# Altium footprint library PcbLib1.PcbLib: 12 footprints
Each footprint in its own frame and in the unit in brackets; x right, y up, seen from the top. Pads: shape width x height; smd on the part's side, far side on the other; paste and mask are expansions set on the pad; w line width, h text height; cw(c..) or ccw(c..) is an arc to the next point about the centre after c.
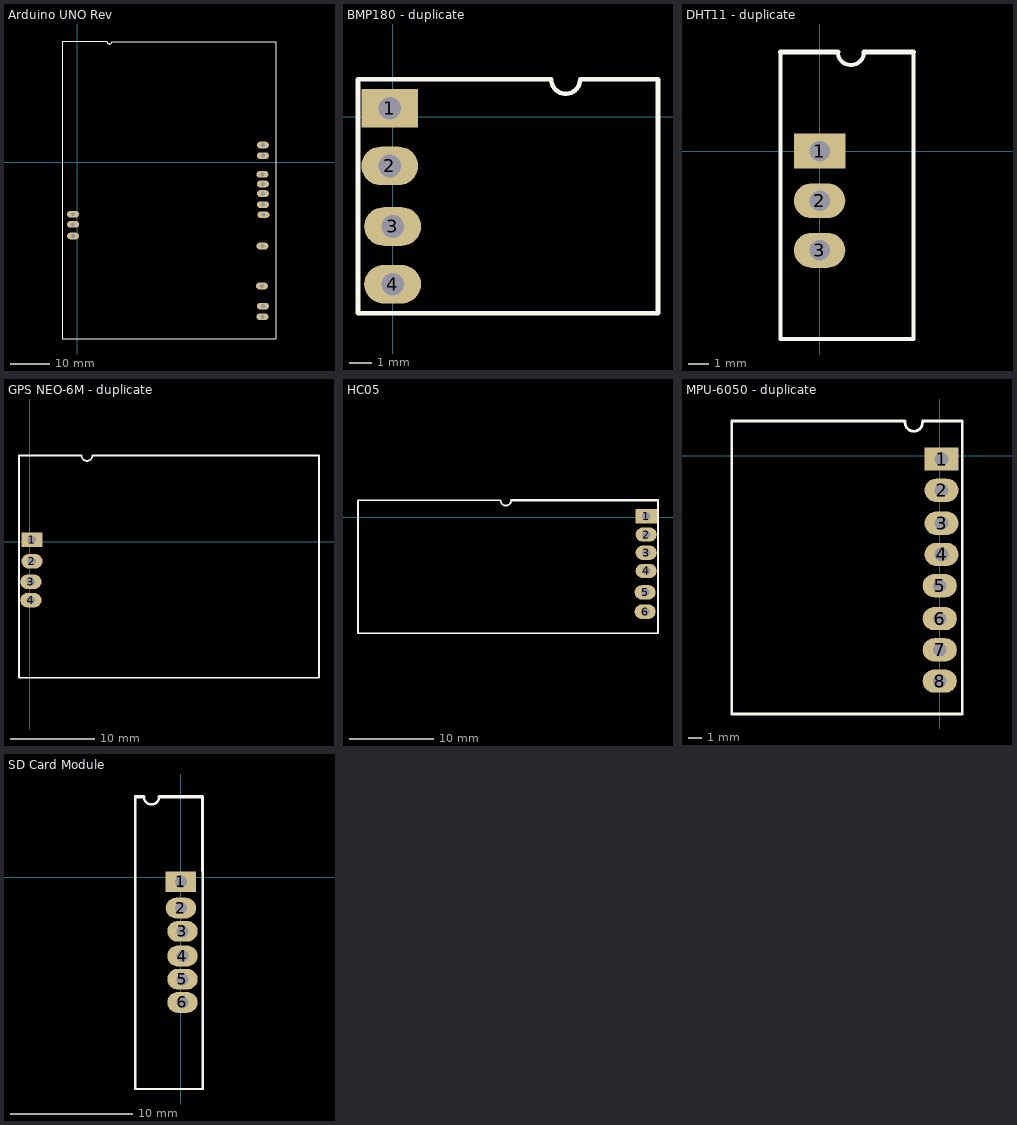
[diagram p0: the footprints below, top view; thin cyan lines are the x and y axes]

## Arduino UNO Rev [mm]
pads (14):
  oval 3x1.7 hole 1: 5(-1.016,-13.081) 6(-1.016,-15.621) 7(-1.016,-18.542) 15(46.609,-38.862) 16(46.736,-36.195) 18(46.482,-31.115) 22(46.609,-21.082) 25(46.863,-13.208) 26(46.736,-10.668) 27(46.736,-7.874) 28(46.736,-5.461) 29(46.609,-3.048) 31(46.736,1.651) 32(46.736,4.318)
Top Overlay:
  lines w0.2: -3.683,-44.45 -3.683,30.431 7.415,30.431 7.493,30.353 ccw(c8.128,30.353) 8.763,30.353 49.911,30.353 49.911,-44.45 16.383,-44.45 -3.683,-44.45
3D body "Arduino_Uno.STEP": height 0.92, standoff -14.68, extent -3.089,-44.298 49.911,30.202

## BMP180 [mm]

## BMP180 - duplicate [mm]
pads (4):
  rect 2.5x1.7 hole 1: 1(-0.127,0.381)
  oval 2.5x1.7 hole 1: 2(-0.127,-2.159) 3(0,-4.826) 4(0,-7.366)
Top Overlay:
  lines w0.2: -1.524,-8.636 -1.524,1.651 6.985,1.651 ccw(c7.62,1.651) 8.255,1.651 11.684,1.651 11.684,-8.636 -1.524,-8.636
3D body "AZDelivery GY-68 BMP-180 v4.step": height 8.61, standoff -2.94, extent -1.397,-8.539 11.593,1.681

## DHT11 [mm]

## DHT11 - duplicate [mm]
pads (3):
  rect 2.5x1.7 hole 1: 1(0,0)
  oval 2.5x1.7 hole 1: 2(0,-2.413) 3(0,-4.826)
Top Overlay:
  lines w0.2: -1.905,4.826 -1.905,-9.144 4.572,-9.144 4.572,4.826 ; 0.889,4.826 ccw(c1.524,4.826) 2.159,4.826
  lines w0.254: -1.905,4.826 0.889,4.826 ; 2.159,4.826 4.572,4.826
3D body "DHT11 module.STEP": height 3.36, standoff -31.69, extent -1.905,-9.174 4.595,4.826

## GPS NEO-6M [mm]

## GPS NEO-6M - duplicate [mm]
pads (4):
  rect 2.5x1.7 hole 1: 1(0.254,0.254)
  oval 2.5x1.7 hole 1: 2(0.254,-2.286) 3(0.127,-4.699) 4(0.127,-6.858)
Top Overlay:
  lines w0.2: -1.27,10.16 -1.27,-16.002 34.036,-16.002 34.036,10.16 7.366,10.16 cw(c6.731,10.16) 6.096,10.16
  lines w0.254: -1.27,10.16 6.096,10.16
3D body "NEO-6M.STEP": height 0.01, standoff -11.93, extent -1.397,-16.091 34.163,10.249

## HC05 [mm]
pads (6):
  rect 2.5x1.7 hole 1: 1(-4.318,0.127)
  oval 2.5x1.7 hole 1: 2(-4.318,-2.032) 3(-4.318,-4.191) 4(-4.318,-6.35) 5(-4.445,-8.89) 6(-4.445,-11.176)
Top Overlay:
  lines w0.2: -20.32,2.032 cw(c-20.955,2.032) -21.59,2.032 -38.481,2.032 -38.481,-13.716 -2.921,-13.716
  lines w0.254: -20.32,2.032 -19.939,2.032 -2.921,2.032 -2.921,-13.716
3D body "HC05_Modulo_sp.STEP": height 5.1, standoff 1.69, extent -38.576,-13.845 -2.826,1.905

## HC-05 [mm]
3D body "HC05_Modulo_sp.STEP": height 36.18, standoff 20.43, extent 1266.83,432.375 1302.58,435.786

## MPU-6050 [mm]

## MPU-6050 - duplicate [mm]
pads (8):
  rect 2.5x1.7 hole 1: 1(0.127,-0.254)
  oval 2.5x1.7 hole 1: 2(0.127,-2.54) 3(0.127,-4.953) 4(0.127,-7.239) 5(0,-9.525) 6(0,-11.938) 7(0,-14.224) 8(0,-16.51)
Top Overlay:
  lines w0.2: -2.54,2.413 ccw(c-1.905,2.413) -1.27,2.413 ; -2.54,2.54 -15.24,2.54 -15.24,-18.923 1.651,-18.923 1.651,2.54 -1.27,2.54
3D body "ITG-MPU.STEP": height 3.26, standoff -8.49, extent -14.981,-19.05 1.519,2.45

## SD Card Module [mm]
pads (6):
  rect 2.5x1.7 hole 1: 1(0,-0.381)
  oval 2.5x1.7 hole 1: 2(0,-2.54) 3(0.127,-4.445) 4(0.127,-6.477) 5(0.127,-8.382) 6(0.127,-10.287)
Top Overlay:
  lines w0.2: -3.737,6.658 -3.737,-17.399 1.778,-17.399 1.778,0.508 ; -3.048,6.604 ccw(c-2.413,6.604) -1.778,6.604
  lines w0.254: -3.683,6.604 -3.048,6.604 ; -1.778,6.604 1.778,6.604 1.778,0.508
3D body "leitor microsd.step": height 0.01, standoff -44.74, extent -3.619,-17.396 0.381,6.604